# Altium footprint library ThanhNT.PcbLib: 579 footprints (part 34 of 37)
Each footprint in its own frame and in the unit in brackets; x right, y up, seen from the top. Pads: shape width x height; smd on the part's side, far side on the other; paste and mask are expansions set on the pad; w line width, h text height; cw(c..) or ccw(c..) is an arc to the next point about the centre after c.
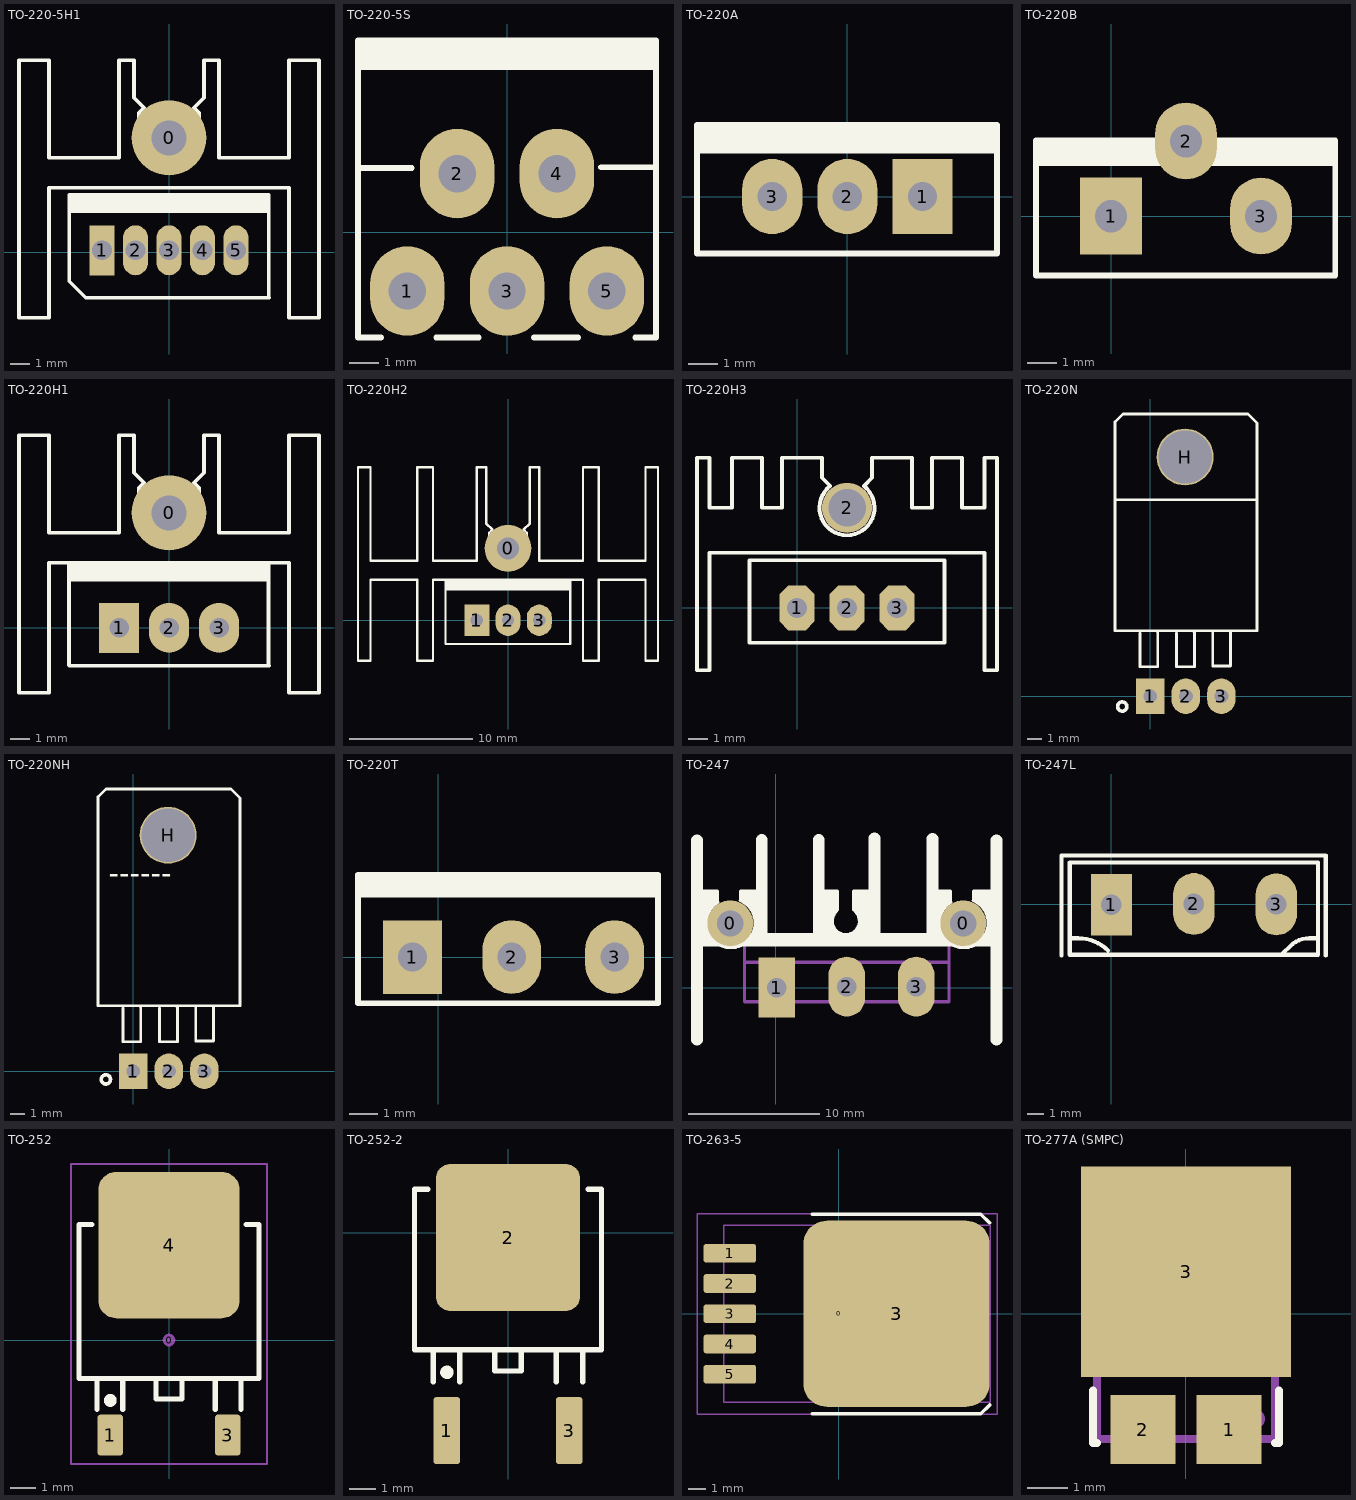
[diagram p33: the footprints below, top view; thin cyan lines are the x and y axes]

## TO-220-5H1 [mil] "TO-220 - 1-2-3"
height 200
pads (6):
  round 150 hole 70: 0(0,229)
  rect 50x100 hole 39.37: 1(-134,4)
  oval 50x100 hole 39.37: 2(-67,4) 3(0,4) 4(67,4) 5(134,4)
Top Overlay:
  rectangle: -198.5,79 200.5,115
  lines w7.87: 198.5,92 199.5,78 ; 199.5,-90 199.5,115 -199.5,115 -199.5,-58 -166.5,-91 200.5,-91 ; -300,-131 -240,-131 -240,129 240,129 240,-131 300,-131 300,384 240,384 240,189 100,189 100,384 70,384 70,309 50,289 60,279 60,209 40,189 -40,189 -60,209 -60,279 -50,289 -70,309 -70,384 -100,384 -100,189 -240,189 -240,384 -300,384 -300,-131
3D body "SW3dPS-TO220AB.STEP": height 904.72, standoff -250, extent -218.5,-79 222.96,105.65

## TO-220-5S [mm]
pads (5):
  oval 2.54x3.048 hole 1.27: 1(-3.4,-2) 2(-1.7,2) 3(0,-2) 4(1.7,2) 5(3.4,-2)
Top Overlay:
  rectangle: -4.991,5.537 5.143,6.452
  lines w0.2: -5.076,2.191 -3.248,2.191 ; -4.293,-3.581 -5.08,-3.581 -5.08,6.534 5.08,6.534 5.08,-3.581 4.369,-3.581 ; -2.413,-3.581 -0.965,-3.581 ; 0.914,-3.581 2.413,-3.581 ; 3.204,2.216 5.033,2.216

## TO-220A [mil] "TO-220 - 3-2-1"
height 200
pads (3):
  rect 80x100 hole 39: 1(100,0)
  oval 80x100 hole 39: 2(0,0) 3(-100,0)
Top Overlay:
  rectangle: -200,57 199,96
  lines w7.87: -200,-76 199,-76 199,95 -200,95 -200,-75
3D body "User Library-TO-220-1.STEP": height 910.24, standoff -222.83, extent -194.88,-81 194.88,96.17

## TO-220B [mm] "TO-220 - 1-2-3"
height 5.08
pads (3):
  rect 2.1x2.6 hole 1.1: 1(0,0)
  oval 2.1x2.6 hole 1.1: 2(2.54,2.54) 3(5.08,0)
Top Overlay:
  rectangle: -2.515,1.702 7.62,2.616
  lines w0.2: -2.54,-2.007 7.595,-2.007 7.595,2.565 -2.54,2.565 -2.54,-2.007
3D body "User Library-TO-220-1.STEP": height 20.58, standoff -8.2, extent -2.41,-2.057 7.49,2.443

## TO-220H1 [mil] "TO-220 - 1-2-3"
height 200
pads (4):
  round 150 hole 70: 0(0,230)
  rect 80x100 hole 39: 1(-100,0)
  oval 80x100 hole 39: 2(0,0) 3(100,0)
Top Overlay:
  rectangle: -201,93 198,129
  lines w7.87: -200,100 198.5,100 199,93 ; -300,-130 -300,385 -240,385 -240,190 -100,190 -100,385 -70,385 -70,310 -50,290 -60,280 -60,210 -40,190 40,190 60,210 60,280 50,290 70,310 70,385 100,385 100,190 240,190 240,385 300,385 300,-130 240,-130 240,130 -240,130 -240,-130 -300,-130 ; -200,-75 -199,-76 -176,-76 200,-76 199,-75 199,130 -200,130 -200,-75
3D body "User Library-Disipador 34M8491-1.STEP": height 1000, standoff -122.05, extent -246,73.03 250.06,328.97
3D body "User Library-TO-220-1.STEP": height 850.24, standoff -282.83, extent -194.88,-82 194.88,95.17

## TO-220H2 [mil] "TO-220 - 1-2-3"
height 200
pads (4):
  round 150 hole 70: 0(0,230)
  rect 80x100 hole 39: 1(-100,0)
  oval 80x100 hole 39: 2(0,0) 3(100,0)
Top Overlay:
  rectangle: -201,95 198,131
  lines w7.87: -200,100 198.5,100 199,93 ; -480,-130 -440,-130 -440,130 -290,130 -290,-130 -240,-130 -240,130 240,130 240,-130 290,-130 290,130 440,130 440,-130 480,-130 480,490 440,490 440,190 290,190 290,490 240,490 240,190 100,190 100,490 70,490 70,310 50,290 60,280 60,210 40,190 -40,190 -60,210 -60,280 -50,290 -70,310 -70,490 -100,490 -100,190 -240,190 -240,490 -290,490 -290,190 -440,190 -440,490 -480,490 -480,-130 ; -200,-75 -200,130 199,130 199,-75 200,-76 -176,-76 -199,-76 -200,-75
3D body "User Library-heat sink-1.STEP": height 1205.51, standoff 0, extent -448.79,-177 452.79,468.67
3D body "User Library-TO-220-1.STEP": height 810.24, standoff -322.83, extent -194.76,-82.17 195,95

## TO-220H3 [mil] "TO-220 1-2-3"
pads (4):
  oct 70x90 hole 40: 1(0,0) 2(100,0) 3(200,0)
  round 100 hole 75: 2(100,200)
Top Overlay:
  lines w7.87: 66,244 50,260 50,300 -30,300 -30,200 -70,200 -70,300 -130,300 -130,200 -175,200 -175,300 -200,300 -200,-125 -175,-125 -175,110 375,110 375,-125 400,-125 400,300 375,300 375,200 330,200 330,300 270,300 270,200 230,200 230,300 150,300 150,260 133.59,243.59 ; 66.37,243.52 ccw(c100,200) 133.77,243.41 ; -95,-70 295,-70 295,95 -95,95 -95,-70
3D body "User Library-TO-220-1.STEP": height 322.83, standoff -810.24, extent -96.88,-76.17 292.88,101
3D body "SW3dPS-heatsink TO126.STEP": height 984.25, standoff -149.61, extent -189.97,-102.25 391.97,323

## TO-220N [mil] "TO-220 - 1-2-3"
height 200
pads (4):
  rect 80x100 hole 39: 1(0,0)
  oval 80x100 hole 39: 2(100,0) 3(200,0)
  round 160 hole 150: H(98,673)
Top Overlay:
  circle w10: c-79.03,-29 r12.97
  lines w7.87: -99,549 -99,772 -77,794 275,794 300,769 300,730 ; -99,552 -99,184 300,184 300,553 -98,553 ; -29,178 -29,83 21,83 21,180 20,181 ; 74,178 74,83 124,83 124,180 123,181 ; 176,180 176,85 226,85 226,182 225,183 ; 300,552 300,733
3D body "SW3dPS-mje-700 and 800.STEP": height 121, standoff -160, extent -48,-10.31 252,792.31

## TO-220NH [mil] "TO-220 - 1-2-3"
height 200
pads (4):
  rect 80x100 hole 39: 1(0,0)
  oval 80x100 hole 39: 2(100,0) 3(200,0)
  round 160 hole 150: H(98,664)
Top Overlay:
  circle w10: c-77.03,-23 r12.97
  lines w7.87: -99,549 -99,772 -77,794 275,794 300,769 300,730 ; -99,552 -99,184 300,184 300,553 ; -29,178 -29,83 21,83 21,180 20,181 ; 74,178 74,83 124,83 124,180 123,181 ; 176,180 176,85 226,85 226,182 225,183 ; 300,552 300,733
  text "------" at -69,527 h60
3D body "SW3DPS-TO-220-DEFAULT.STEP": height 165.35, standoff -118.11, extent -100,8.34 300,775.66

## TO-220T [mil] "TO-220 - 1-2-3"
height 200
pads (3):
  rect 80x100 hole 39: 1(-35,0)
  oval 80x100 hole 39: 2(100,0) 3(240,0)
Top Overlay:
  rectangle: -109,81 298,112
  lines w7.87: -109,-63 299,-63 299,112 -109,112 -109,-63
3D body "SW3dPS-Transistor TO 220.STEP": height 722.05, standoff -293.7, extent -104.76,-64.17 300.76,113

## TO-247 [mil]
pads (5):
  round 137.8 hole 78.74: 0(-136.34,194) 0(563.66,194)
  rect 110x180 hole 59.06: 1(3,1)
  oval 110x180 hole 59.06: 2(213.66,4) 3(422.32,4)
Top Overlay:
  region: 595,290 595,265 615,245 620,245 630,235 630,225 635,220 635,160 660,160 665,165 650,180 650,290
  region: 475,290 525,290 525,255 520,255 500,235 500,225 490,215 490,180 495,175 495,160 475,160
  region: -225,290 -175,290 -175,255 -180,255 -200,235 -200,225 -210,215 -210,180 -205,175 -205,160 -225,160
  region: -105,290 -105,265 -85,245 -80,245 -70,235 -70,225 -65,220 -65,160 -40,160 -35,165 -50,180 -50,290
  region: 140,290 190,290 190,240 170,220 170,180 190,160 140,160
  region: 230,290 290,290 290,150 280,160 230,160 250,180 250,220 230,240
  lines w10: -225,290 -175,290 -175,260 ; -173.69,257.87 ccw(c-135,195) -105.92,262.86 ; -163.31,220 ccw(c-134.15,190.85) -105,220 ; -105,265 -105,290 -55,290 ; 130,290 185,290 185,235 180,230 ; 181.96,229.73 ccw(c210.85,200.85) 239.73,229.73 ; 240,230 235,235 235,290 280,290 ; 475,290 525,290 525,260 ; 526.31,257.87 ccw(c565,195) 594.08,262.86 ; 595,265 595,290 645,290
  lines w35: -236.34,-156 -236.34,444 ; -42,149 -42,445 ; 129,149 129,445 ; 297,148 297,450 ; 471,148 471,448 ; 663.66,-156 663.66,444
  lines w40: -230,145 655,145
Mechanical 1:
  lines w10: -93.43,76.83 520.75,76.83 ; -93.43,-41.28 -93.43,135.89 520.75,135.89 520.75,-41.28 -93.43,-41.28
3D body "User Library-heat sink-1.STEP": height 1355.51, standoff 150, extent -240.79,-200.67 660.79,445
3D body "SW3dPS-TO-247.STEP": height 1060, standoff -360, extent -95,-105 505,75

## TO-247L [mil]
pads (3):
  rect 100x150 hole 50: 1(0,-1)
  oval 100x150 hole 50: 2(200,1) 3(400,0)
Top Overlay:
  lines w10: -121,-124 -121,119 520,119 520,-124 ; -102,-121 -101,-120 -101,102 501,102 501,-122 -101,-122 -100,-121 ; -100,-82 -80.43,-82 cw(c-80.43,-184.43) -8,-112 ; 415,-119 ccw(c415,-116.59) 416.71,-118.29 434,-101 cw(c479.87,-146.87) 479.87,-82 499,-82
3D body "SW3dPS-to-247ad.STEP": height 1146.77, standoff -470.16, extent -108.98,-117 518.98,81.03
3D body "SW3dPS-aavid 6298b.STEP": height 1100, standoff 100, extent -619,-365 1031,597

## TO-252 [mm] "D-PAK/TO-252-AA; 3 Leads (1 Cropped); Body 10.3 (inc. leads) x 6.7 mm (LxW max)"
height 2.38
pads (4):
  round 0.5 on Mech15: 0(0,0)
  rrect25% 1x1.6 smd: 1(-2.285,-3.7) 3(2.285,-3.7)
  rrect25% 5.5x5.7 smd: 4(0,3.7)
Top Overlay:
  circle w0.25: c-2.285,-2.35 r0.125
  lines w0.2: -3,4.5 -3.5,4.5 -3.5,-1.5 3.5,-1.5 3.5,4.5 3,4.5 ; -2.8,-2.7 -2.8,-1.5 -1.8,-1.5 -1.8,-2.7 ; 1.8,-2.7 1.8,-1.5 2.8,-1.5 2.8,-2.7 ; -0.5,-2.3 0.5,-2.3 0.5,-1.5 -0.5,-1.5 -0.5,-2.3
Mechanical 15:
  lines w0.076: -3.81,-4.826 3.81,-4.826 3.81,6.858 -3.81,6.858 -3.81,-4.826
3D body "DPAK.stp": height 2.31, standoff 0, extent -3.3,-3.951 3.3,5.762

## TO-252-2 [mm] "TO252, 2 Pins"
height 2.5
pads (3):
  rrect20% 1x2.5 smd: 1(-2.29,-7.4) 3(2.29,-7.4)
  rrect20% 5.4x5.5 smd: 2(0,-0.178)
Top Overlay:
  circle w0.25: c-2.285,-5.22 r0.125
  lines w0.2: -3,1.63 -3.5,1.63 -3.5,-4.37 3.5,-4.37 3.5,1.63 3,1.63 ; -2.8,-5.57 -2.8,-4.37 -1.8,-4.37 -1.8,-5.57 ; 1.8,-5.57 1.8,-4.37 2.8,-4.37 2.8,-5.57 ; -0.5,-5.17 -0.5,-4.37 0.5,-4.37 0.5,-5.17 -0.5,-5.17
3D body "TO252-2.STEP": height 2.31, standoff 0.01, extent -3.3,-8.209 3.3,2.021

## TO-263-5 [mm] "D-PAK/TO-263-5; 5 Leads; Body 14.4 (inc. leads) x 10.4 mm (LxW max)"
height 4.65
pads (7):
  round 0.5 on Mech15: 0(0,0)
  rrect25% 2.95x1.05 smd: 1(-6.15,3.41) 2(-6.15,1.705) 3(-6.15,0) 4(-6.15,-1.705) 5(-6.15,-3.41)
  rrect25% 10.5x10.5 smd: 3(3.25,0)
Top Overlay:
  lines w0.2: -1.5,-5.644 8,-5.644 8.5,-5.144 ; -1.5,5.621 8,5.621 8.5,5.121
Mechanical 13:
  lines w0.076: -6.49,-5 -6.49,5 8.534,5 8.534,-5 -6.49,-5
Mechanical 15:
  lines w0.076: -8,-5.664 -8,5.639 8.915,5.639 8.915,-5.664 -8,-5.664
3D body "TO-263-5.stp": height 4.56, standoff 0, extent -6.727,-5.08 7.288,5.08

## TO-277A (SMPC) [mm]
pads (3):
  rect 1.6x1.7 smd: 1(1.065,-2.865) 2(-1.065,-2.865)
  rect 5.2x5.2 smd paste-10: 3(0,1.04)
Top Overlay:
  lines w0.2: -2.3,-1.9 -2.3,-3.2 -2.2,-3.2 ; 2.2,-3.2 2.3,-3.2 2.3,-1.9
Top Paste:
  region: -0.1,2.5 -1.8,2.5 -1.8,0.6 -0.1,0.6
  region: 1.8,2.5 0.1,2.5 0.1,0.6 1.8,0.6
  region: 1.8,0.4 0.1,0.4 0.1,-1.5 1.8,-1.5
  region: 2.55,-0.7 1.8,-0.7 1.8,-1.5 2.55,-1.5
  rectangle: -2.55,-1.5 -1.8,-0.7
  rectangle: -1.05,2.7 1.05,3.6
  rectangle: -1.8,-1.5 -0.1,0.4
Top Solder:
  rectangle: -2,-1.65 2,2.7
  rectangle: -2.7,-1.65 -2,-0.6
  region: 2.7,-0.6 2,-0.6 2,-1.65 2.7,-1.65
  rectangle: -1.2,2.7 1.2,3.7
Mechanical 16:
  circle w0.3: c1.7,-2.6 r0.1
  lines w0.2: -2.2,-3.1 2.2,-3.1 2.2,3.1 -2.2,3.1 -2.2,-3.1
3D body "TO-277A(SMPC).step": height 1.2, standoff 0, extent -2.375,-3.35 2.375,3.3